# Altium schematic symbol library MiscPower.SchLib: 1552 symbols (part 19 of 22) (continued)
## LP3925RMX-E/NOPB
designator U?
High Performance Power Management Unit for Handset Applications, 81-pin Micro SMDXT; PartNumber: LP3925RMX-E/NOPB; Manufacturer: National Semiconductor; PackageTopMarking: XYTT*I V030; PowerWise: N; CompType: MiscPower; High-Reliability: Y; DatasheetVersion: Jul-2011; PackageVersion: revA, Feb-2011; PackageReference: RMD81AAA; PackageDescription: Thin Micro SMDxt, 81 Bump, 0.4 mm Pitch; RoHS: Y; PinCount: 81; ComponentLink1Description: Manufacturer URL; ComponentLink1URL: http://www.national.com/; ComponentLink2Description: LP3925 Datasheet; ComponentLink2URL: http://www.national.com/ds/LP/LP3925.pdf; ComponentLink3Description: LP3925 Web Page; ComponentLink3URL: http://www.national.com/pf/LP/LP3925.html; ComponentLink4Description: RMD81AAA Package Page; ComponentLink4URL: http://www.national.com/packaging/folders/rmd81aaa.html
footprint RMD81AAA (Micro SMD, 81-Leads, Body 3.62x3.62mm, Pitch 0.4mm, NSC Recommended)
part A pins: A3 XIN (in), A4 XOUT (out), A5 LDO1 (out), A7 LDO2 (out), A8 LDO3 (out), A9 LDO5 (out), B3 PWR_ON (in), B4 VCOIN (power), B5 LDO_UPWR, B6 TCXO1_I* (io), B7 RSTIN_N (in), B8 LDO4 (out), C1 BATT (power), C3 TCXO1_O* (io), C4 TCXO2_O* (io), C5 TCXO2_I* (io), C6 RSTOUT_N (out), C7 SLEEP_N (TCXO_EN) (in), C8 LDO8 (out), C9 LDO6 (out), D1 BATT (power), D2 VTRM (power), D3 OSC_32KHZ* (io), D4 HF_PWR (in), D5 SEL (in), D6 SIM_RST* (io), D7 SIM_CLK* (io), D8 SIM_IO* (io), D9 LDO7 (out), E1 D- (io), E2 OE_N* (io), E3 RCV* (io), E4 SPND* (io), E6 SIM_RST_IN* (io), E7 SIM_CLK_IN* (io), E8 SIM_DATA* (io), F1 D+ (io), F2 SEO/VM* (io), F3 SCL (in), F4 RSENSE* (io), F5 INP1* (io), F6 INP2* (io), F8 SINK2* (io), F9 LDO9 (out), G2 DATA/VP* (io), G3 SDA (io), G5 IRQ_N (oc), G7 SINK3* (io), G8 SINK1* (io), G9 LDO10 (out), H1 FB_B1 (power), H3 FB_B2 (power), H5 FB_B3 (power), H7 PS_HOLD (in), H8 REF_OUT (power), H9 LDO11 (out), J2 SW_B1 (out), J4 SW_B2 (out), J6 SW_B3 (out), J7 LDO13 (out), J9 LDO12 (out)
part B pins: A1 VDD (power), A2 VIN_CHG (power), A6 VIN1 (power), B1 VDD (power), B2 VIN_CHG (power), B9 VIN2 (power), C2 VIN_CHG (power), E5 GND (power), E9 VIN3 (power), F7 GND_SINK (power), G1 USB_GND (power), G4 GND_B2 (power), G6 GND_B3 (power), H2 GND_B1 (power), H4 GND_B2 (power), H6 GND_B3 (power), J1 VIN_B1 (power), J3 VIN_B2 (power), J5 VIN_B3 (power), J8 VIN4 (power)

## LP3927ILQ-AZ
designator U?
Cellular/PCS System Power Management IC, 28-pin LLP; PartNumber: LP3927ILQ-AZ; Manufacturer: National Semiconductor; PackageTopMarking: NS*UZXYTTE#*3927-AZ; PowerWise: N; CompType: MiscPower; High-Reliability: Y; DatasheetVersion: Dec-2005; PackageVersion: revB, Jul-2001; PackageReference: LQA28A; PackageDescription: LLP, Plastic, Quad, 5 x 5 x 0.75mm Body, 28 Lead, 0.5mm Pitch; RoHS: N; PinCount: 28; Code_JEDEC: MO-220-WHHD-1; ComponentLink1Description: Manufacturer URL; ComponentLink1URL: http://www.national.com/; ComponentLink2Description: LP3927 Datasheet; ComponentLink2URL: http://www.national.com/ds/LP/LP3927.pdf; ComponentLink3Description: LP3927 Web Page; ComponentLink3URL: http://www.national.com/pf/LP/LP3927.html; ComponentLink4Description: LQA28A Package Page; ComponentLink4URL: http://www.national.com/packaging/folders/lqa28a.html
footprint LQA28A (PQFN, 28-Leads, Body 5x5mm, Pitch 0.5mm, Thermal Pad 3.3x3.3mm, NSC Recommended)
pins: 1 VO1 (out), 2 EN5 (in), 3 EN4 (in), 4 EN3 (in), 5 ~{RST} (oc), 6 ~{IRQ} (oc), 7 PS_HOLD (in), 8 KYBD (in), 9 D_GND (power), 10 ~{VEXT} (in), 11 BYP, 12 TEST_MODE (in), 13 LED_EN (in), 14 LED (oc), 15 LED_PGM (in), 16 OP_AMP OUT (out), 17 IN- (in), 18 IN+ (in), 19 OP_AMP_VDD (power), 20 A_GND2 (power), 21 VO5 (out), 22 VDD3 (power), 23 VO4 (out), 24 VDD2 (power), 25 VO3 (out), 26 A_GND1 (power), 27 VO2 (out), 28 VDD1 (power), 29 DAP (power)

## LP3927ILQ-AZ/NOPB
designator U?
Cellular/PCS System Power Management IC, 28-pin LLP, Pb-Free; PartNumber: LP3927ILQ-AZ/NOPB; Manufacturer: National Semiconductor; PackageTopMarking: NS*UZXYTTE#*3927-AZ; PowerWise: N; CompType: MiscPower; High-Reliability: Y; DatasheetVersion: Dec-2005; PackageVersion: revB, Jul-2001; PackageReference: LQA28A; PackageDescription: LLP, Plastic, Quad, 5 x 5 x 0.75mm Body, 28 Lead, 0.5mm Pitch; RoHS: Y; PinCount: 28; Code_JEDEC: MO-220-WHHD-1; ComponentLink1Description: Manufacturer URL; ComponentLink1URL: http://www.national.com/; ComponentLink2Description: LP3927 Datasheet; ComponentLink2URL: http://www.national.com/ds/LP/LP3927.pdf; ComponentLink3Description: LP3927 Web Page; ComponentLink3URL: http://www.national.com/pf/LP/LP3927.html; ComponentLink4Description: LQA28A Package Page; ComponentLink4URL: http://www.national.com/packaging/folders/lqa28a.html
footprint LQA28A (PQFN, 28-Leads, Body 5x5mm, Pitch 0.5mm, Thermal Pad 3.3x3.3mm, NSC Recommended)
pins: 1 VO1 (out), 2 EN5 (in), 3 EN4 (in), 4 EN3 (in), 5 ~{RST} (oc), 6 ~{IRQ} (oc), 7 PS_HOLD (in), 8 KYBD (in), 9 D_GND (power), 10 ~{VEXT} (in), 11 BYP, 12 TEST_MODE (in), 13 LED_EN (in), 14 LED (oc), 15 LED_PGM (in), 16 OP_AMP OUT (out), 17 IN- (in), 18 IN+ (in), 19 OP_AMP_VDD (power), 20 A_GND2 (power), 21 VO5 (out), 22 VDD3 (power), 23 VO4 (out), 24 VDD2 (power), 25 VO3 (out), 26 A_GND1 (power), 27 VO2 (out), 28 VDD1 (power), 29 DAP (power)

## LP3927ILQX-AJ
designator U?
Cellular/PCS System Power Management IC, 28-pin LLP; PartNumber: LP3927ILQX-AJ; Manufacturer: National Semiconductor; PackageTopMarking: NS*UZXYTTE#*3927-AJ; PowerWise: N; CompType: MiscPower; High-Reliability: Y; DatasheetVersion: Dec-2005; PackageVersion: revB, Jul-2001; PackageReference: LQA28A; PackageDescription: LLP, Plastic, Quad, 5 x 5 x 0.75mm Body, 28 Lead, 0.5mm Pitch; RoHS: N; PinCount: 28; Code_JEDEC: MO-220-WHHD-1; ComponentLink1Description: Manufacturer URL; ComponentLink1URL: http://www.national.com/; ComponentLink2Description: LP3927 Datasheet; ComponentLink2URL: http://www.national.com/ds/LP/LP3927.pdf; ComponentLink3Description: LP3927 Web Page; ComponentLink3URL: http://www.national.com/pf/LP/LP3927.html; ComponentLink4Description: LQA28A Package Page; ComponentLink4URL: http://www.national.com/packaging/folders/lqa28a.html
footprint LQA28A (PQFN, 28-Leads, Body 5x5mm, Pitch 0.5mm, Thermal Pad 3.3x3.3mm, NSC Recommended)
pins: 1 VO1 (out), 2 EN5 (in), 3 EN4 (in), 4 EN3 (in), 5 ~{RST} (oc), 6 ~{IRQ} (oc), 7 PS_HOLD (in), 8 KYBD (in), 9 D_GND (power), 10 ~{VEXT} (in), 11 BYP, 12 TEST_MODE (in), 13 LED_EN (in), 14 LED (oc), 15 LED_PGM (in), 16 OP_AMP OUT (out), 17 IN- (in), 18 IN+ (in), 19 OP_AMP_VDD (power), 20 A_GND2 (power), 21 VO5 (out), 22 VDD3 (power), 23 VO4 (out), 24 VDD2 (power), 25 VO3 (out), 26 A_GND1 (power), 27 VO2 (out), 28 VDD1 (power), 29 DAP (power)

## LP3927ILQX-AZ
designator U?
Cellular/PCS System Power Management IC, 28-pin LLP; PartNumber: LP3927ILQX-AZ; Manufacturer: National Semiconductor; PackageTopMarking: NS*UZXYTTE#*3927-AZ; PowerWise: N; CompType: MiscPower; High-Reliability: Y; DatasheetVersion: Dec-2005; PackageVersion: revB, Jul-2001; PackageReference: LQA28A; PackageDescription: LLP, Plastic, Quad, 5 x 5 x 0.75mm Body, 28 Lead, 0.5mm Pitch; RoHS: N; PinCount: 28; Code_JEDEC: MO-220-WHHD-1; ComponentLink1Description: Manufacturer URL; ComponentLink1URL: http://www.national.com/; ComponentLink2Description: LP3927 Datasheet; ComponentLink2URL: http://www.national.com/ds/LP/LP3927.pdf; ComponentLink3Description: LP3927 Web Page; ComponentLink3URL: http://www.national.com/pf/LP/LP3927.html; ComponentLink4Description: LQA28A Package Page; ComponentLink4URL: http://www.national.com/packaging/folders/lqa28a.html
footprint LQA28A (PQFN, 28-Leads, Body 5x5mm, Pitch 0.5mm, Thermal Pad 3.3x3.3mm, NSC Recommended)
pins: 1 VO1 (out), 2 EN5 (in), 3 EN4 (in), 4 EN3 (in), 5 ~{RST} (oc), 6 ~{IRQ} (oc), 7 PS_HOLD (in), 8 KYBD (in), 9 D_GND (power), 10 ~{VEXT} (in), 11 BYP, 12 TEST_MODE (in), 13 LED_EN (in), 14 LED (oc), 15 LED_PGM (in), 16 OP_AMP OUT (out), 17 IN- (in), 18 IN+ (in), 19 OP_AMP_VDD (power), 20 A_GND2 (power), 21 VO5 (out), 22 VDD3 (power), 23 VO4 (out), 24 VDD2 (power), 25 VO3 (out), 26 A_GND1 (power), 27 VO2 (out), 28 VDD1 (power), 29 DAP (power)

## LP3927ILQX-AZ/NOPB
designator U?
Cellular/PCS System Power Management IC, 28-pin LLP, Pb-Free; PartNumber: LP3927ILQX-AZ/NOPB; Manufacturer: National Semiconductor; PackageTopMarking: NS*UZXYTTE#*3927-AZ; PowerWise: N; CompType: MiscPower; High-Reliability: Y; DatasheetVersion: Dec-2005; PackageVersion: revB, Jul-2001; PackageReference: LQA28A; PackageDescription: LLP, Plastic, Quad, 5 x 5 x 0.75mm Body, 28 Lead, 0.5mm Pitch; RoHS: Y; PinCount: 28; Code_JEDEC: MO-220-WHHD-1; ComponentLink1Description: Manufacturer URL; ComponentLink1URL: http://www.national.com/; ComponentLink2Description: LP3927 Datasheet; ComponentLink2URL: http://www.national.com/ds/LP/LP3927.pdf; ComponentLink3Description: LP3927 Web Page; ComponentLink3URL: http://www.national.com/pf/LP/LP3927.html; ComponentLink4Description: LQA28A Package Page; ComponentLink4URL: http://www.national.com/packaging/folders/lqa28a.html
footprint LQA28A (PQFN, 28-Leads, Body 5x5mm, Pitch 0.5mm, Thermal Pad 3.3x3.3mm, NSC Recommended)
pins: 1 VO1 (out), 2 EN5 (in), 3 EN4 (in), 4 EN3 (in), 5 ~{RST} (oc), 6 ~{IRQ} (oc), 7 PS_HOLD (in), 8 KYBD (in), 9 D_GND (power), 10 ~{VEXT} (in), 11 BYP, 12 TEST_MODE (in), 13 LED_EN (in), 14 LED (oc), 15 LED_PGM (in), 16 OP_AMP OUT (out), 17 IN- (in), 18 IN+ (in), 19 OP_AMP_VDD (power), 20 A_GND2 (power), 21 VO5 (out), 22 VDD3 (power), 23 VO4 (out), 24 VDD2 (power), 25 VO3 (out), 26 A_GND1 (power), 27 VO2 (out), 28 VDD1 (power), 29 DAP (power)

## LP3928TLX-1828/NOPB
designator U?
High Speed Bi-Directional Level Shifter and Ultra Low-Dropout CMOS Voltage Regulator, 16-pin Micro SMD, Pb-Free; PartNumber: LP3928TLX-1828/NOPB; Manufacturer: National Semiconductor; PackageTopMarking: XYTT*I L8B; PowerWise: N; CompType: MiscPower; High-Reliability: Y; DatasheetVersion: Oct-2002; PackageVersion: revC, Jan-2004; PackageReference: TLA16AAA; PackageDescription: Thin Micro SMD, 36-Bump (Large), 0.5 mm Pitch; RoHS: Y; PinCount: 16; Code_JEDEC: MO-211-DF; ComponentLink1Description: Manufacturer URL; ComponentLink1URL: http://www.national.com/; ComponentLink2Description: LP3928 Datasheet; ComponentLink2URL: http://www.national.com/ds/LP/LP3928.pdf; ComponentLink3Description: LP3928 Web Page; ComponentLink3URL: http://www.national.com/pf/LP/LP3928.html; ComponentLink4Description: TLA16AAA Package Page; ComponentLink4URL: http://www.national.com/packaging/folders/tla16aaa.html
footprint TLA16AAA (Micro SMD, 16-Leads, Body 2.0x2.0mm, Pitch 0.5mm, NSC Recommended)
pins: A1 VBAT (power), A2 EN2 (in), A3 GND (power), A4 EN1 (in), B1 VCCB (power), B2 DIR2 (in), B3 DIR1 (in), B4 VCCA (power), C1 B1 (io), C2 LatchClk (in), C3 DIR3 (in), C4 A1 (io), D1 B2 (io), D2 B3 (io), D3 A3 (io), D4 A2 (io)

## LP3929TME-AACQ
designator U?
High Speed Bi-Directional Level Shifter and Ultra Low-Dropout CMOS Voltage Regulator and Line Protection, 24-pin Micro SMD; PartNumber: LP3929TME-AACQ; Manufacturer: National Semiconductor; PackageTopMarking: XYTT*I D57B; PowerWise: N; CompType: MiscPower; High-Reliability: Y; DatasheetVersion: Dec-2007; PackageVersion: revA, 2007; PackageReference: TME24AAA; PackageDescription: Thin Micro SMD, Depopulated, 24 Bump, 0.4mm Pitch; RoHS: Y; PinCount: 24; ComponentLink1Description: Manufacturer URL; ComponentLink1URL: http://www.national.com/; ComponentLink2Description: LP3929 Datasheet; ComponentLink2URL: http://www.national.com/ds/LP/LP3929.pdf; ComponentLink3Description: LP3929 Web Page; ComponentLink3URL: http://www.national.com/pf/LP/LP3929.html; ComponentLink4Description: TME24AAA Package Page; ComponentLink4URL: http://www.national.com/packaging/folders/tme24aaa.html
footprint TME24AAA (Micro SMD, 24-Leads, Body 2.02x2.02mm, Pitch 0.4mm, NSC Recommended)
pins: A1 D2_A (io), A2 CMD_DIR (in), A3 DIR_0 (in), A4 VBAT (power), A5 D2_B (io), B1 D3_A (io), B3 VDDA (power), B4 VDDB (power), B5 D3_B (io), C1 CLK_A (in), C2 EN (in), C3 VSS (power), C4 VSS (power), C5 CLK_B (out), D1 D0_A (io), D2 CMD_A (io), D3 CD (in), D4 CMD_B (io), D5 D0_B (io), E1 D1_A (io), E2 FCLK_A (out), E3 DIR_1-3 (in), E4 WP (in), E5 D1_B (io)

## LP3929TME-AACQ/NOPB
designator U?
High Speed Bi-Directional Level Shifter and Ultra Low-Dropout CMOS Voltage Regulator and Line Protection, 24-pin Micro SMD, Pb-Free; PartNumber: LP3929TME-AACQ/NOPB; Manufacturer: National Semiconductor; PackageTopMarking: XYTT*I D57B; PowerWise: N; CompType: MiscPower; High-Reliability: Y; DatasheetVersion: Dec-2007; PackageVersion: revA, 2007; PackageReference: TME24AAA; PackageDescription: Thin Micro SMD, Depopulated, 24 Bump, 0.4mm Pitch; RoHS: Y; PinCount: 24; ComponentLink1Description: Manufacturer URL; ComponentLink1URL: http://www.national.com/; ComponentLink2Description: LP3929 Datasheet; ComponentLink2URL: http://www.national.com/ds/LP/LP3929.pdf; ComponentLink3Description: LP3929 Web Page; ComponentLink3URL: http://www.national.com/pf/LP/LP3929.html; ComponentLink4Description: TME24AAA Package Page; ComponentLink4URL: http://www.national.com/packaging/folders/tme24aaa.html
footprint TME24AAA (Micro SMD, 24-Leads, Body 2.02x2.02mm, Pitch 0.4mm, NSC Recommended)
pins: A1 D2_A (io), A2 CMD_DIR (in), A3 DIR_0 (in), A4 VBAT (power), A5 D2_B (io), B1 D3_A (io), B3 VDDA (power), B4 VDDB (power), B5 D3_B (io), C1 CLK_A (in), C2 EN (in), C3 VSS (power), C4 VSS (power), C5 CLK_B (out), D1 D0_A (io), D2 CMD_A (io), D3 CD (in), D4 CMD_B (io), D5 D0_B (io), E1 D1_A (io), E2 FCLK_A (out), E3 DIR_1-3 (in), E4 WP (in), E5 D1_B (io)

## LP3936SL
designator U?
Lighting Management System for Six White LEDs and One RGB or FLASH LED, 32-pin Laminate TCSP; PartNumber: LP3936SL; Manufacturer: National Semiconductor; PackageTopMarking: NSUZXYTTE#*LP3936SL; PowerWise: Y; CompType: MiscPower; DatasheetVersion: Jun-2005; PackageVersion: revA, Aug-2001; PackageReference: SLD32A; PackageDescription: Thin CSP, Plastic, Laminated, 4.5 x 5.5 x 0.8mm Body, 32 Lead, 0.5mm Pitch; RoHS: N; PinCount: 32; High-Reliability: Y; Code_JEDEC: MO-208-GEEA; ComponentLink1Description: Manufacturer URL; ComponentLink1URL: http://www.national.com/; ComponentLink2Description: LP3936 Datasheet; ComponentLink2URL: http://www.national.com/ds/LP/LP3936.pdf; ComponentLink3Description: LP3936 Web Page; ComponentLink3URL: http://www.national.com/pf/LP/LP3936.html; ComponentLink4Description: SLD32A Package Page; ComponentLink4URL: http://www.national.com/packaging/folders/sld32a.html
footprint SLD32A (PQFN, 32-Leads (9x7 pads), Body 4.5x5.5mm, Pitch 0.5mm, NSC Recommended)
pins: 1 GND_BOOST (power), 2 FB (in), 3 VDD2 (power), 4 GND2 (power), 5 WLED1 (oc), 6 WLED2 (oc), 7 WLED3 (oc), 8 WLED4 (oc), 9 GND_WLED (power), 10 WLED5 (oc), 11 WLED6 (oc), 12 VDDA (out), 13 GND1 (power), 14 VDD1 (power), 15 AIN (in), 16 AREF (out), 17 GND_T (power), 18 VREF (out), 19 RT (in), 20 MW_SEL (in), 21 NRST (in), 22 CS (io), 23 DO (out), 24 DI (in), 25 SCL (in), 26 RGB_EN (in), 27 VDD_IO (power), 28 ROUT (oc), 29 GOUT (oc), 30 BOUT (oc), 31 GND_RGB (power), 32 OUT (oc)

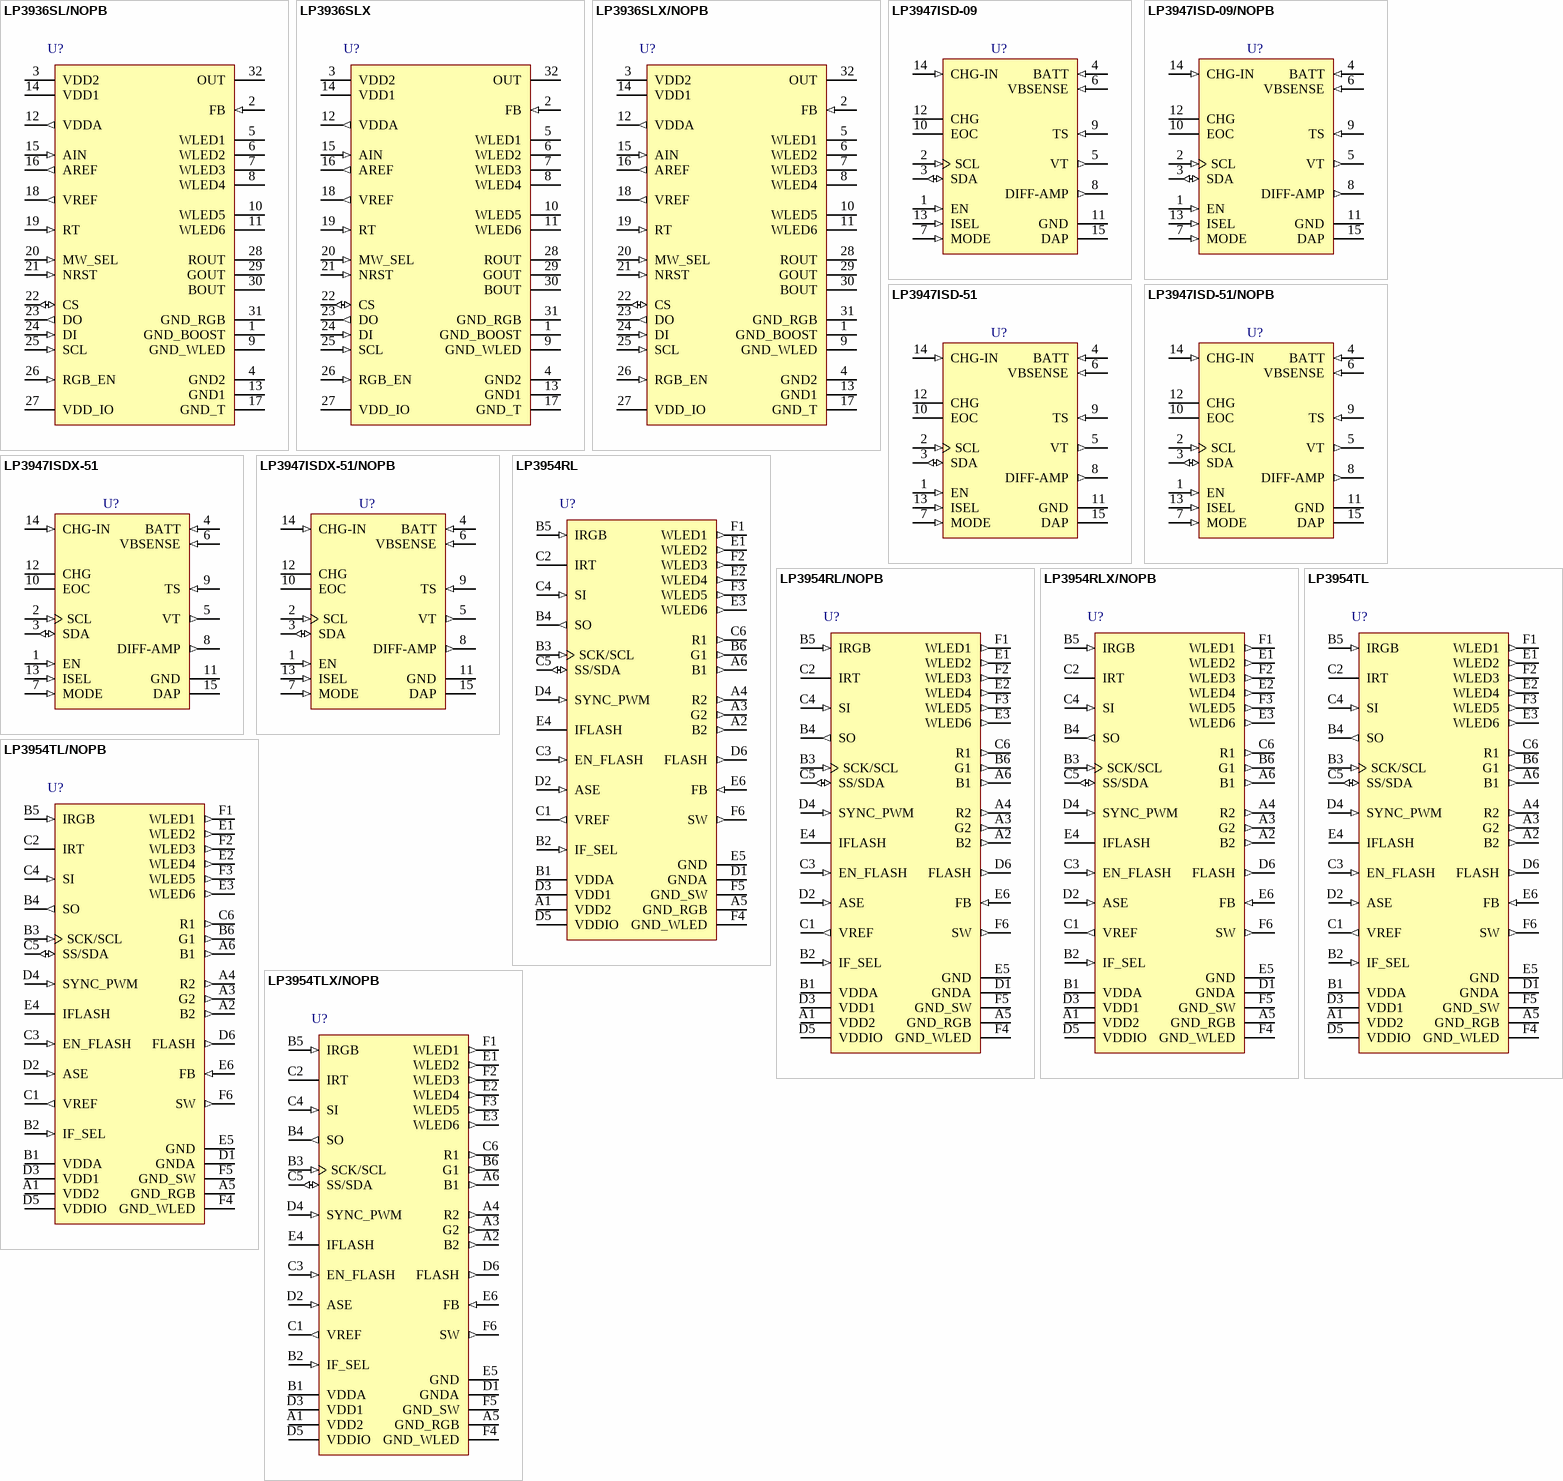
[diagram p45: symbols LP3936SL/NOPB to LP3954TLX/NOPB]

## LP3936SL/NOPB
designator U?
Lighting Management System for Six White LEDs and One RGB or FLASH LED, 32-pin Laminate TCSP, Pb-Free; PartNumber: LP3936SL/NOPB; Manufacturer: National Semiconductor; PackageTopMarking: NSUZXYTTE#*LP3936SL; PowerWise: Y; CompType: MiscPower; DatasheetVersion: Jun-2005; PackageVersion: revA, Aug-2001; PackageReference: SLD32A; PackageDescription: Thin CSP, Plastic, Laminated, 4.5 x 5.5 x 0.8mm Body, 32 Lead, 0.5mm Pitch; RoHS: Y; PinCount: 32; High-Reliability: Y; Code_JEDEC: MO-208-GEEA; ComponentLink1Description: Manufacturer URL; ComponentLink1URL: http://www.national.com/; ComponentLink2Description: LP3936 Datasheet; ComponentLink2URL: http://www.national.com/ds/LP/LP3936.pdf; ComponentLink3Description: LP3936 Web Page; ComponentLink3URL: http://www.national.com/pf/LP/LP3936.html; ComponentLink4Description: SLD32A Package Page; ComponentLink4URL: http://www.national.com/packaging/folders/sld32a.html
footprint SLD32A (PQFN, 32-Leads (9x7 pads), Body 4.5x5.5mm, Pitch 0.5mm, NSC Recommended)
pins: 1 GND_BOOST (power), 2 FB (in), 3 VDD2 (power), 4 GND2 (power), 5 WLED1 (oc), 6 WLED2 (oc), 7 WLED3 (oc), 8 WLED4 (oc), 9 GND_WLED (power), 10 WLED5 (oc), 11 WLED6 (oc), 12 VDDA (out), 13 GND1 (power), 14 VDD1 (power), 15 AIN (in), 16 AREF (out), 17 GND_T (power), 18 VREF (out), 19 RT (in), 20 MW_SEL (in), 21 NRST (in), 22 CS (io), 23 DO (out), 24 DI (in), 25 SCL (in), 26 RGB_EN (in), 27 VDD_IO (power), 28 ROUT (oc), 29 GOUT (oc), 30 BOUT (oc), 31 GND_RGB (power), 32 OUT (oc)

## LP3936SLX
designator U?
Lighting Management System for Six White LEDs and One RGB or FLASH LED, 32-pin Laminate TCSP; PartNumber: LP3936SLX; Manufacturer: National Semiconductor; PackageTopMarking: NSUZXYTTE#*LP3936SL; PowerWise: Y; CompType: MiscPower; DatasheetVersion: Jun-2005; PackageVersion: revA, Aug-2001; PackageReference: SLD32A; PackageDescription: Thin CSP, Plastic, Laminated, 4.5 x 5.5 x 0.8mm Body, 32 Lead, 0.5mm Pitch; RoHS: N; PinCount: 32; High-Reliability: Y; Code_JEDEC: MO-208-GEEA; ComponentLink1Description: Manufacturer URL; ComponentLink1URL: http://www.national.com/; ComponentLink2Description: LP3936 Datasheet; ComponentLink2URL: http://www.national.com/ds/LP/LP3936.pdf; ComponentLink3Description: LP3936 Web Page; ComponentLink3URL: http://www.national.com/pf/LP/LP3936.html; ComponentLink4Description: SLD32A Package Page; ComponentLink4URL: http://www.national.com/packaging/folders/sld32a.html
footprint SLD32A (PQFN, 32-Leads (9x7 pads), Body 4.5x5.5mm, Pitch 0.5mm, NSC Recommended)
pins: 1 GND_BOOST (power), 2 FB (in), 3 VDD2 (power), 4 GND2 (power), 5 WLED1 (oc), 6 WLED2 (oc), 7 WLED3 (oc), 8 WLED4 (oc), 9 GND_WLED (power), 10 WLED5 (oc), 11 WLED6 (oc), 12 VDDA (out), 13 GND1 (power), 14 VDD1 (power), 15 AIN (in), 16 AREF (out), 17 GND_T (power), 18 VREF (out), 19 RT (in), 20 MW_SEL (in), 21 NRST (in), 22 CS (io), 23 DO (out), 24 DI (in), 25 SCL (in), 26 RGB_EN (in), 27 VDD_IO (power), 28 ROUT (oc), 29 GOUT (oc), 30 BOUT (oc), 31 GND_RGB (power), 32 OUT (oc)

## LP3936SLX/NOPB
designator U?
Lighting Management System for Six White LEDs and One RGB or FLASH LED, 32-pin Laminate TCSP, Pb-Free; PartNumber: LP3936SLX/NOPB; Manufacturer: National Semiconductor; PackageTopMarking: NSUZXYTTE#*LP3936SL; PowerWise: Y; CompType: MiscPower; DatasheetVersion: Jun-2005; PackageVersion: revA, Aug-2001; PackageReference: SLD32A; PackageDescription: Thin CSP, Plastic, Laminated, 4.5 x 5.5 x 0.8mm Body, 32 Lead, 0.5mm Pitch; RoHS: Y; PinCount: 32; High-Reliability: Y; Code_JEDEC: MO-208-GEEA; ComponentLink1Description: Manufacturer URL; ComponentLink1URL: http://www.national.com/; ComponentLink2Description: LP3936 Datasheet; ComponentLink2URL: http://www.national.com/ds/LP/LP3936.pdf; ComponentLink3Description: LP3936 Web Page; ComponentLink3URL: http://www.national.com/pf/LP/LP3936.html; ComponentLink4Description: SLD32A Package Page; ComponentLink4URL: http://www.national.com/packaging/folders/sld32a.html
footprint SLD32A (PQFN, 32-Leads (9x7 pads), Body 4.5x5.5mm, Pitch 0.5mm, NSC Recommended)
pins: 1 GND_BOOST (power), 2 FB (in), 3 VDD2 (power), 4 GND2 (power), 5 WLED1 (oc), 6 WLED2 (oc), 7 WLED3 (oc), 8 WLED4 (oc), 9 GND_WLED (power), 10 WLED5 (oc), 11 WLED6 (oc), 12 VDDA (out), 13 GND1 (power), 14 VDD1 (power), 15 AIN (in), 16 AREF (out), 17 GND_T (power), 18 VREF (out), 19 RT (in), 20 MW_SEL (in), 21 NRST (in), 22 CS (io), 23 DO (out), 24 DI (in), 25 SCL (in), 26 RGB_EN (in), 27 VDD_IO (power), 28 ROUT (oc), 29 GOUT (oc), 30 BOUT (oc), 31 GND_RGB (power), 32 OUT (oc)

## LP3947ISD-09
designator U?
USB/AC Adaptor, Single Cell Li-Ion Battery Charger IC, 14-pin LLP; PartNumber: LP3947ISD-09; Manufacturer: National Semiconductor; PackageTopMarking: NS*UZXYTT*L00061B; PowerWise: Y; CompType: MiscPower; DatasheetVersion: Jul-2006; PackageVersion: revA, Jul-2004; PackageReference: SDA14B; PackageDescription: LLP, Plastic, Dual, 4 x 4 x 0.8mm Body, 14 Lead, 0.5mm Pitch, No Pullback; RoHS: N; PinCount: 14; High-Reliability: Y; ComponentLink1Description: Manufacturer URL; ComponentLink1URL: http://www.national.com/; ComponentLink2Description: LP3947 Datasheet; ComponentLink2URL: http://www.national.com/ds/LP/LP3947.pdf; ComponentLink3Description: LP3947 Web Page; ComponentLink3URL: http://www.national.com/pf/LP/LP3947.html; ComponentLink4Description: SDA14B Package Page; ComponentLink4URL: http://www.national.com/packaging/folders/sda14b.html
footprint SDA14B (SON, 14-Leads, Body 4x4mm, Pitch 0.5mm, NSC Recommended)
pins: 1 EN (in), 2 SCL (in), 3 SDA (io), 4 BATT (in), 5 VT (out), 6 VBSENSE (in), 7 MODE (in), 8 DIFF-AMP (out), 9 TS (in), 10 EOC (oc), 11 GND (power), 12 CHG (oc), 13 ISEL (in), 14 CHG-IN (in), 15 DAP (power)

## LP3947ISD-09/NOPB
designator U?
USB/AC Adaptor, Single Cell Li-Ion Battery Charger IC, 14-pin LLP, Pb-Free; PartNumber: LP3947ISD-09/NOPB; Manufacturer: National Semiconductor; PackageTopMarking: NS*UZXYTT*L00061B; PowerWise: Y; CompType: MiscPower; DatasheetVersion: Jul-2006; PackageVersion: revA, Jul-2004; PackageReference: SDA14B; PackageDescription: LLP, Plastic, Dual, 4 x 4 x 0.8mm Body, 14 Lead, 0.5mm Pitch, No Pullback; RoHS: Y; PinCount: 14; High-Reliability: Y; ComponentLink1Description: Manufacturer URL; ComponentLink1URL: http://www.national.com/; ComponentLink2Description: LP3947 Datasheet; ComponentLink2URL: http://www.national.com/ds/LP/LP3947.pdf; ComponentLink3Description: LP3947 Web Page; ComponentLink3URL: http://www.national.com/pf/LP/LP3947.html; ComponentLink4Description: SDA14B Package Page; ComponentLink4URL: http://www.national.com/packaging/folders/sda14b.html
footprint SDA14B (SON, 14-Leads, Body 4x4mm, Pitch 0.5mm, NSC Recommended)
pins: 1 EN (in), 2 SCL (in), 3 SDA (io), 4 BATT (in), 5 VT (out), 6 VBSENSE (in), 7 MODE (in), 8 DIFF-AMP (out), 9 TS (in), 10 EOC (oc), 11 GND (power), 12 CHG (oc), 13 ISEL (in), 14 CHG-IN (in), 15 DAP (power)

## LP3947ISD-51
designator U?
USB/AC Adaptor, Single Cell Li-Ion Battery Charger IC, 14-pin LLP; PartNumber: LP3947ISD-51; Manufacturer: National Semiconductor; PackageTopMarking: NS*UZXYTT*L00062B; PowerWise: Y; CompType: MiscPower; DatasheetVersion: Jul-2006; PackageVersion: revA, Jul-2004; PackageReference: SDA14B; PackageDescription: LLP, Plastic, Dual, 4 x 4 x 0.8mm Body, 14 Lead, 0.5mm Pitch, No Pullback; RoHS: N; PinCount: 14; High-Reliability: Y; ComponentLink1Description: Manufacturer URL; ComponentLink1URL: http://www.national.com/; ComponentLink2Description: LP3947 Datasheet; ComponentLink2URL: http://www.national.com/ds/LP/LP3947.pdf; ComponentLink3Description: LP3947 Web Page; ComponentLink3URL: http://www.national.com/pf/LP/LP3947.html; ComponentLink4Description: SDA14B Package Page; ComponentLink4URL: http://www.national.com/packaging/folders/sda14b.html
footprint SDA14B (SON, 14-Leads, Body 4x4mm, Pitch 0.5mm, NSC Recommended)
pins: 1 EN (in), 2 SCL (in), 3 SDA (io), 4 BATT (in), 5 VT (out), 6 VBSENSE (in), 7 MODE (in), 8 DIFF-AMP (out), 9 TS (in), 10 EOC (oc), 11 GND (power), 12 CHG (oc), 13 ISEL (in), 14 CHG-IN (in), 15 DAP (power)